# Altium footprint library lib_protel_HC.PCBLIB: 724 footprints (part 20 of 46)
Each footprint in its own frame and in the unit in brackets; x right, y up, seen from the top. Pads: shape width x height; smd on the part's side, far side on the other; paste and mask are expansions set on the pad; w line width, h text height; cw(c..) or ccw(c..) is an arc to the next point about the centre after c.
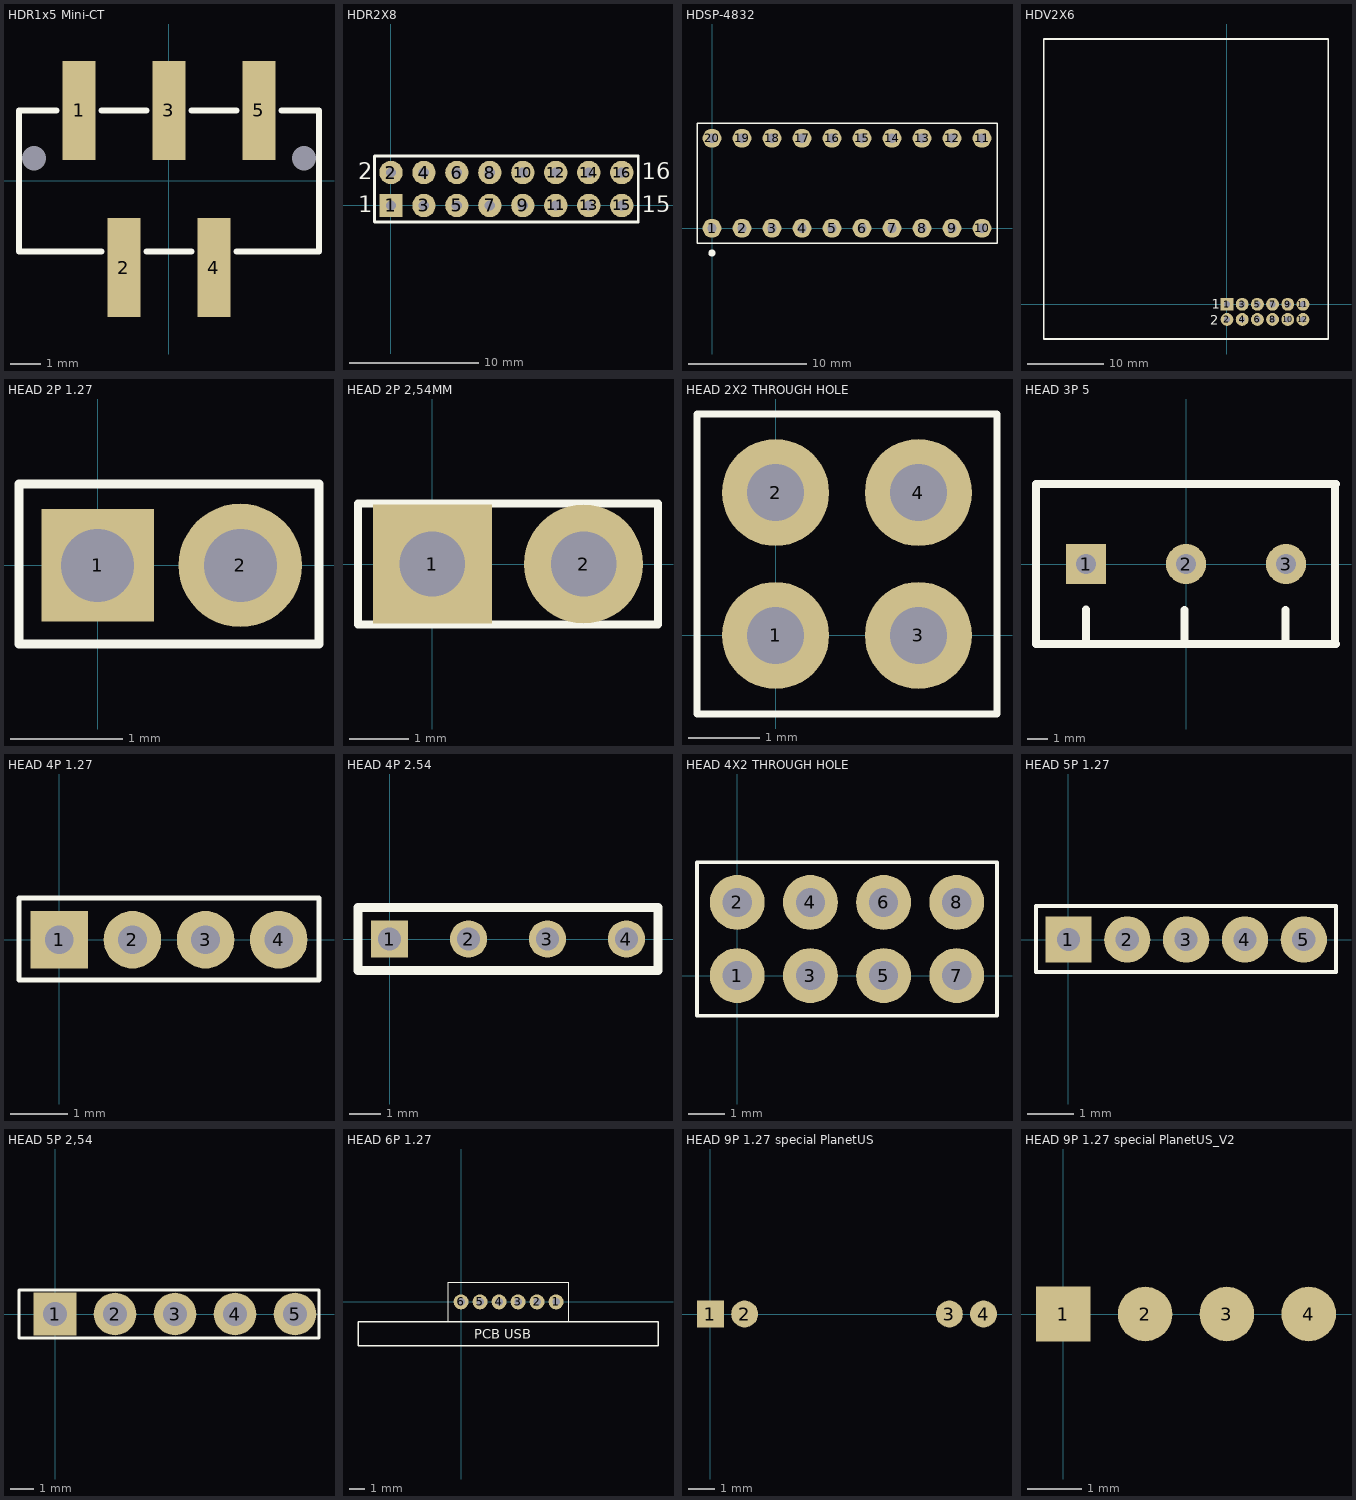
[diagram p19: the footprints below, top view; thin cyan lines are the x and y axes]

## HDR1x5 Mini-CT [mm] "Header 5Pin, Pitch = 1.5mm Mini-CT, con tetón"
height 6.9
pads (7):
  rect 1.1x3.3 smd: 1(-3,2.35) 2(-1.5,-2.9) 3(0,2.35) 4(1.5,-2.9) 5(3,2.35)
  round 0 hole 0.8: ""(-4.5,0.75) ""(4.5,0.75)
Top Overlay:
  lines w0.2: -3.75,2.35 -5,2.35 -5,-2.35 -2.25,-2.35 ; -2.25,2.35 -0.75,2.35 ; -0.75,-2.35 0.75,-2.35 ; 0.75,2.35 2.25,2.35 ; 2.25,-2.35 5,-2.35 5,2.35 3.75,2.35
3D body "c-292230-5-b-3d.stp": height 6.9, standoff -0.8, extent -5,-3.85 5,3.35

## HDR2X8 [mm]
pads (16):
  rect 1.8x1.8 hole 0.8: 1(0,0)
  round 1.8 hole 0.8: 2(0,2.54) 3(2.54,0) 4(2.54,2.54) 5(5.08,0) 6(5.08,2.54) 7(7.62,0) 8(7.62,2.54) 9(10.16,0) 10(10.16,2.54) 11(12.7,0) 12(12.7,2.54) 13(15.24,0) 14(15.24,2.54) 15(17.78,0) 16(17.78,2.54)
Top Overlay:
  lines w0.2: -1.27,-1.27 19.05,-1.27 19.05,3.81 -1.27,3.81 -1.27,-1.27
  text "16" at 19.304,2.032 h1.27
  text "15" at 19.304,-0.508 h1.27
  text "1" at -2.54,-0.508 h1.27
  text "2" at -2.54,2.032 h1.27

## HDSP-4832 [mm] "ARRAY E LED VERDES, AMARILLOS Y ROJOS"
height 6.1
pads (20):
  round 1.6 hole 0.8: 1(0,0) 2(2.54,0) 3(5.08,0) 4(7.62,0) 5(10.16,0) 6(12.7,0) 7(15.24,0) 8(17.78,0) 9(20.32,0) 10(22.86,0) 11(22.86,7.62) 12(20.32,7.62) 13(17.78,7.62) 14(15.24,7.62) 15(12.7,7.62) 16(10.16,7.62) 17(7.62,7.62) 18(5.08,7.62) 19(2.54,7.62) 20(0,7.62)
Top Overlay:
  circle w0.3: c-0.005,-2.1 r0.15
  lines w0.127: -1.27,-1.27 -1.27,8.89 24.13,8.89 24.13,-1.27 -1.27,-1.27

## HDV2X6 [mm] "Conexion módulo Stellaris Serial to Ethernet"
height 5
pads (12):
  rect 1.7x1.7 hole 0.8: 1(0,0)
  round 1.7 hole 0.8: 2(0,-2) 3(2,0) 4(2,-2) 5(4,0) 6(4,-2) 7(6,0) 8(6,-2) 9(8,0) 10(8,-2) 11(10,0) 12(10,-2)
Top Overlay:
  lines w0.2: -24.13,-4.572 -24.13,34.925 13.335,34.925 13.335,-4.572 -24.13,-4.572
  text "2" at -2.21,-2.692 h1.27
  text "1" at -2.007,-0.61 h1.27

## HEAD 2P 1.27 [mm] "4 PINES PITCH 1.27mm"
height 4.6
pads (2):
  rect 1x1 hole 0.65: 1(0,0)
  round 1.1 hole 0.65: 2(1.27,0)
Top Overlay:
  lines w0.08: 1.97,0.7 1.97,-0.7 -0.7,-0.7 -0.7,0.725 1.97,0.725

## HEAD 2P 2,54MM [mm]
height 10
pads (2):
  rect 2x2 hole 1.1: 1(0,0)
  round 2 hole 1.1: 2(2.54,0)
Top Overlay:
  lines w0.127: -1.25,-1.016 -1.25,1.016 3.79,1.016 3.79,-1.016 -1.25,-1.016

## HEAD 2X2 THROUGH HOLE [mm]
pads (4):
  round 1.5 hole 0.8: 1(0,0) 2(0,2) 3(2,0) 4(2,2)
Top Overlay:
  lines w0.1: -1.1,-1.1 -1.1,3.1 3.1,3.1 3.1,-1.1 -1.1,-1.1

## HEAD 3P 5 [mm] "5 PINES PITCH 1.27mm"
height 11
pads (3):
  rect 2x2 hole 1: 1(-5,0)
  round 2 hole 1: 2(0,0) 3(5,0)
Top Overlay:
  lines w0.4: -5,-3.975 -5,-2.275 ; -0.075,-4 -0.075,-2.3 ; 4.975,-4 4.975,-2.3 ; 7.45,-4 7.45,3.9 ; 7.5,-4 -7.5,-4 -7.5,4 7.5,4

## HEAD 4P 1.27 [mm] "4 PINES PITCH 1.27mm"
height 4.6
pads (4):
  rect 1x1 hole 0.5: 1(0,0)
  round 1 hole 0.5: 2(1.27,0) 3(2.54,0) 4(3.81,0)
Top Overlay:
  lines w0.08: 4.51,0.7 4.51,-0.7 -0.7,-0.7 -0.7,0.725 4.51,0.725
3D body "BD020-04-X-E-0350-0300-X-X_revF.STEP": height 5.76, standoff -3.28, extent -0.587,-1.25 4.493,1.25

## HEAD 4P 2.54 [mm]
pads (4):
  rect 1.2x1.2 hole 0.75: 1(0,0)
  round 1.2 hole 0.75: 2(2.54,0) 3(5.08,0) 4(7.62,0)
Top Overlay:
  lines w0.3: -1.016,-1.016 8.636,-1.016 8.636,1.016 -1.016,1.016 -1.016,-1.016

## HEAD 4X2 THROUGH HOLE [mm]
pads (8):
  round 1.5 hole 0.8: 1(0,0) 2(0,2) 3(2,0) 4(2,2) 5(4,0) 6(4,2) 7(6,0) 8(6,2)
Top Overlay:
  lines w0.1: -1.1,-1.1 -1.1,3.1 7.1,3.1 7.1,-1.1 -1.1,-1.1

## HEAD 5P 1.27 [mm] "5 PINES PITCH 1.27mm"
height 4.6
pads (5):
  rect 1x1 hole 0.5: 1(0,0)
  round 1 hole 0.5: 2(1.27,0) 3(2.54,0) 4(3.81,0) 5(5.08,0)
Top Overlay:
  lines w0.08: -0.7,-0.7 -0.7,0.25 -0.7,0.725 5.775,0.725 5.775,0.305 5.775,-0.7 -0.7,-0.7

## HEAD 5P 2,54 [mm] "5 PINES PITCH 2,54mm"
height 10
pads (5):
  rect 1.8x1.8 hole 1: 1(0,0)
  round 1.8 hole 1: 2(2.54,0) 3(5.08,0) 4(7.62,0) 5(10.16,0)
Top Overlay:
  lines w0.127: -1.524,-1.016 11.176,-1.016 11.176,1.016 -1.524,1.016 -1.524,0 -1.524,-1.016
3D body "61300511121.stp": height 1.37, standoff -10.17, extent -1.25,-1.22 11.45,1.32

## HEAD 6P 1.27 [mm] "6 PINES PITCH 1.27mm"
height 4.5
pads (6):
  round 1 hole 0.5: 1(6.35,0) 2(5.08,0) 3(3.81,0) 4(2.54,0) 5(1.27,0) 6(0,0)
Top Overlay:
  lines w0.08: 7.163,-1.3 -0.848,-1.3 -0.848,0 -0.848,1.3 7.188,1.3 ; 7.184,-1.3 7.188,-1.295 7.188,1.295
  lines w0.1: -6.883,-2.921 -6.883,-1.321 13.157,-1.321 13.157,-2.921 -6.883,-2.921
  text "PCB USB" at 0.889,-2.464 h0.64

## HEAD 9P 1.27 special PlanetUS [mm] "4P pads for 9 pin header. Intermediate pins of header must be removed"
pads (4):
  rect 1x1 smd: 1(0,0)
  round 1 smd: 2(1.27,0) 3(8.89,0) 4(10.16,0)

## HEAD 9P 1.27 special PlanetUS_V2 [mm] "4P pads for 9 pin header. Intermediate pins of header must be removed"
pads (4):
  rect 1x1 smd: 1(0,0)
  round 1 smd: 2(1.5,0) 3(3,0) 4(4.5,0)